# Altium schematic symbol library Hydra_Ref_sch.SCHLIB: 791 symbols (part 5 of 5)
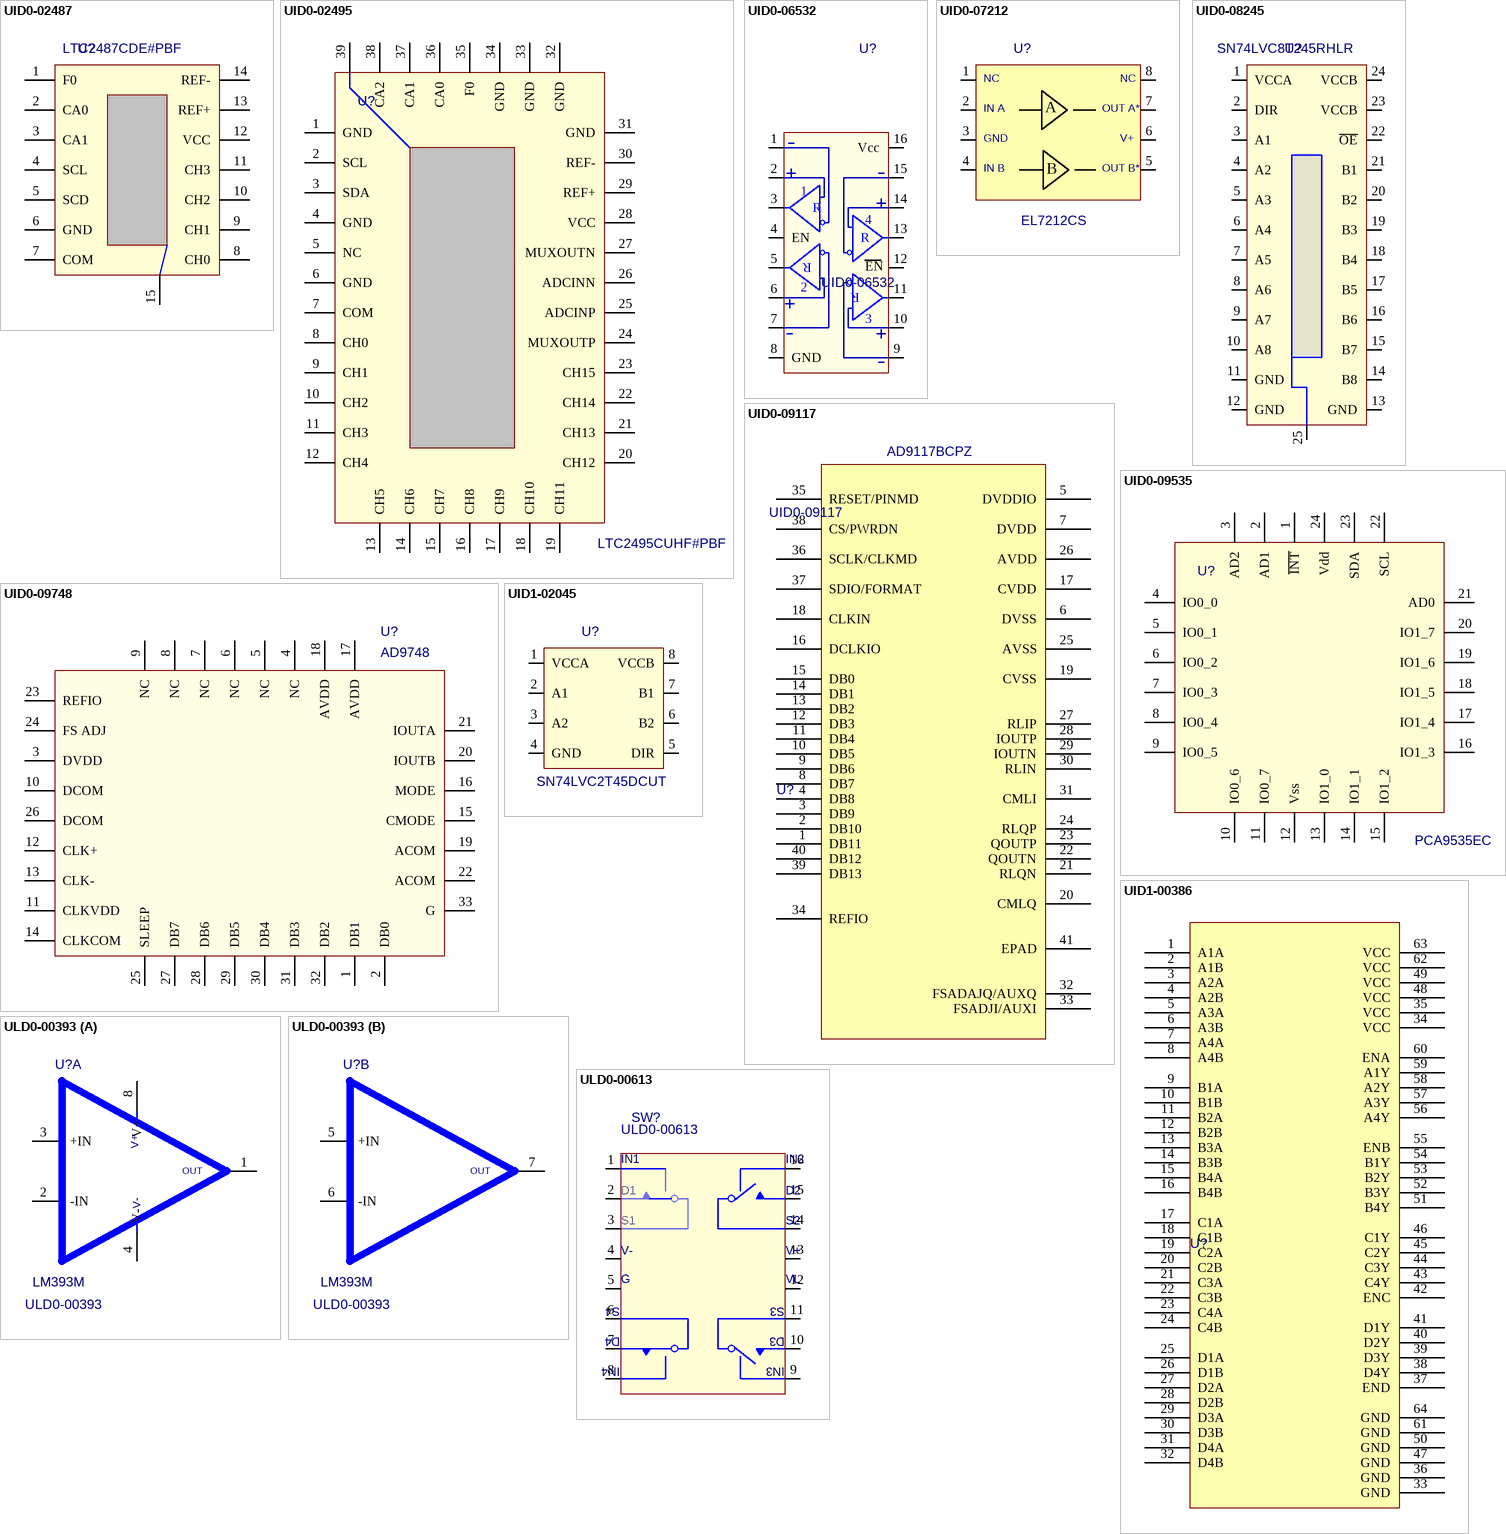
[diagram p26: symbols UID0-02487 to ULD0-00613]

## UID0-09117
designator U?  M_PN: AD9117BCPZ
DAC_14B_QUAD;PIO-IN;20MA-OUT;1.8V,3.3V;40-LEAD;LFCSP_VQ; MFGR: ANALOG DEVICES; level: 1; G_PN: UID0-09117; item_number: UID0-09117
footprint QFN50P600X600X100-40N (QFN, 40-Leads, Body 6.0x6.0mm (max), Pitch 0.50mm, IPC Medium Density)
pins: 1 DB11, 2 DB10, 3 DB9, 4 DB8, 5 DVDDIO, 6 DVSS, 7 DVDD, 8 DB7, 9 DB6, 10 DB5, 11 DB4, 12 DB3, 13 DB2, 14 DB1, 15 DB0, 16 DCLKIO, 17 CVDD, 18 CLKIN, 19 CVSS, 20 CMLQ, 21 RLQN, 22 QOUTN, 23 QOUTP, 24 RLQP, 25 AVSS, 26 AVDD, 27 RLIP, 28 IOUTP, 29 IOUTN, 30 RLIN, 31 CMLI, 32 FSADAJQ/AUXQ, 33 FSADJI/AUXI, 34 REFIO, 35 RESET/PINMD, 36 SCLK/CLKMD, 37 SDIO/FORMAT, 38 CS/PWRDN, 39 DB13, 40 DB12, 41 EPAD

## UID0-09535
designator U?, comment M_PN: PCA9535EC  (hidden comment: 16-bit I2C-bus GPIO;3.3V SUPPLY;OPEN DRAIN OUTPUTS;QFN24)
Value: PCA9535EC; NoLoad: .; Approved: CL; MFGR: ON SEMI; G_PN: UID0-09535; level: 1; ModifyDate: 5/10/12; item_number: UID0-09535
footprint SOIC127P1539X265-24N (SOP, 16-Leads, Body 10.1x5.3mm, Pitch 1.27mm, IPC Medium Density    SOP, 24-Leads, Body 15.39x7.5x2.65mm, Pitch 1.27mm, IPC Medium Density)
pins: 1 ~{INT}, 2 AD1, 3 AD2, 4 IO0_0, 5 IO0_1, 6 IO0_2, 7 IO0_3, 8 IO0_4, 9 IO0_5, 10 IO0_6, 11 IO0_7, 12 Vss, 13 IO1_0, 14 IO1_1, 15 IO1_2, 16 IO1_3, 17 IO1_4, 18 IO1_5, 19 IO1_6, 20 IO1_7, 21 AD0, 22 SCL, 23 SDA, 24 Vdd

## UID0-09748
designator U?, comment M_PN: AD9748  (hidden comment: AD9748 8-Bit, 210 MSPS, DIFF OUTPUT CURRENT, Tx DAC, 3.3V, SMT 32 pin LFCSP PKG)
MFGR: ANALOG DEVICES; Approved: NM; NoLoad: .; G_PN: UID0-09748; level: 1; ModifyDate: 12/05/12; item_number: UID0-09748
footprint QFN50P500X500X100-33V2N (Jedec-MO-220-VHHD-2; QFN, 33-Leads, Body 5x5x1mm, Pitch 0.50mm, IPC Medium Density)
pins: 1 DB1, 2 DB0, 3 DVDD, 4 NC, 5 NC, 6 NC, 7 NC, 8 NC, 9 NC, 10 DCOM, 11 CLKVDD, 12 CLK+, 13 CLK-, 14 CLKCOM, 15 CMODE, 16 MODE, 17 AVDD, 18 AVDD, 19 ACOM, 20 IOUTB, 21 IOUTA, 22 ACOM, 23 REFIO, 24 FS ADJ, 25 SLEEP, 26 DCOM, 27 DB7, 28 DB6, 29 DB5, 30 DB4, 31 DB3, 32 DB2, 33 G

## UID1-00386
designator U?
16 LINE RECEIVERS;LVDS;3.3V SUPPLY;INT TERMINATIONS;TSSOP-64; NoLoad: .; Approved: CL; Value: SN65LVDT386DGGR; MFGR: TEXAS INSTRUMENT; level: 1; ModifyDate: 3/20/13; M_PN: SN65LVDT386DGGR; item_number: UID1-00386; G_PN: UID1-00386
footprint SOP50P810X120-64M (SOP, 64-Leads, Body 17.1x6.2mm (max), Pitch 0.50mm)
pins: 1 A1A, 2 A1B, 3 A2A, 4 A2B, 5 A3A, 6 A3B, 7 A4A, 8 A4B, 9 B1A, 10 B1B, 11 B2A, 12 B2B, 13 B3A, 14 B3B, 15 B4A, 16 B4B, 17 C1A, 18 C1B, 19 C2A, 20 C2B, 21 C3A, 22 C3B, 23 C4A, 24 C4B, 25 D1A, 26 D1B, 27 D2A, 28 D2B, 29 D3A, 30 D3B, 31 D4A, 32 D4B, 33 GND, 34 VCC, 35 VCC, 36 GND, 37 END, 38 D4Y, 39 D3Y, 40 D2Y, 41 D1Y, 42 ENC, 43 C4Y, 44 C3Y, 45 C2Y, 46 C1Y, 47 GND, 48 VCC, 49 VCC, 50 GND, 51 B4Y, 52 B3Y, 53 B2Y, 54 B1Y, 55 ENB, 56 A4Y, 57 A3Y, 58 A2Y, 59 A1Y, 60 ENA, 61 GND, 62 VCC, 63 VCC, 64 GND

## UID1-02045
designator U?, comment M_PN: SN74LVC2T45DCUT  (hidden comment: SSN74LVC2T45YZPR;1.6V/5.5V;2-bit;dual supply non-inverting level traslator;DCU package)
Value: SN74LVC2T45DCUT; NoLoad: .; Approved: CL; MFGR: TEXAS INSTRUMENTS; G_PN: UID1-02045; level: 1; ModifyDate: 6/12/14; item_number: UID1-02045
footprint DCU-TI (old part)
pins: 1 VCCA, 2 A1, 3 A2, 4 GND, 5 DIR, 6 B2, 7 B1, 8 VCCB

## ULD0-00393
designator U?, comment M_PN: LM393M  G_PN: ULD0-00393  (hidden comment: COMPARATOR;DUAL;3MV.VOS;5NA IOS; SOIC-8)
Value: LM393M; NoLoad: .; Approved: CL; MFGR: ON SEMI; level: 1; ModifyDate: 02/22/12; item_number: ULD0-00393
footprint SO8_MS-012 (JEDEC M-012)
part A pins: 1 OUT, 2 -IN, 3 +IN, 4 V-, 8 V+
part B pins: 5 +IN, 6 -IN, 7 OUT

## ULD0-00613
designator SW?, comment G_PN: ULD0-00613  (hidden comment: QUAD SPST ANALOG SW;200NS;45 OHM;SO-16)
Value: DG613DY; MFGR: VISHAY; NoLoad: .; Approved: NM; level: 1; ModifyDate: 2/20/13; M_PN: DG613DY; item_number: ULD0-00613
footprint SOIC-16_Vishay (Footprint not found)
pins: 1 IN1, 2 D1, 3 S1, 4 V-, 5 G, 6 S4, 7 D4, 8 IN4, 9 IN3, 10 D3, 11 S3, 12 VL, 13 V+, 14 S2, 15 D2, 16 IN2

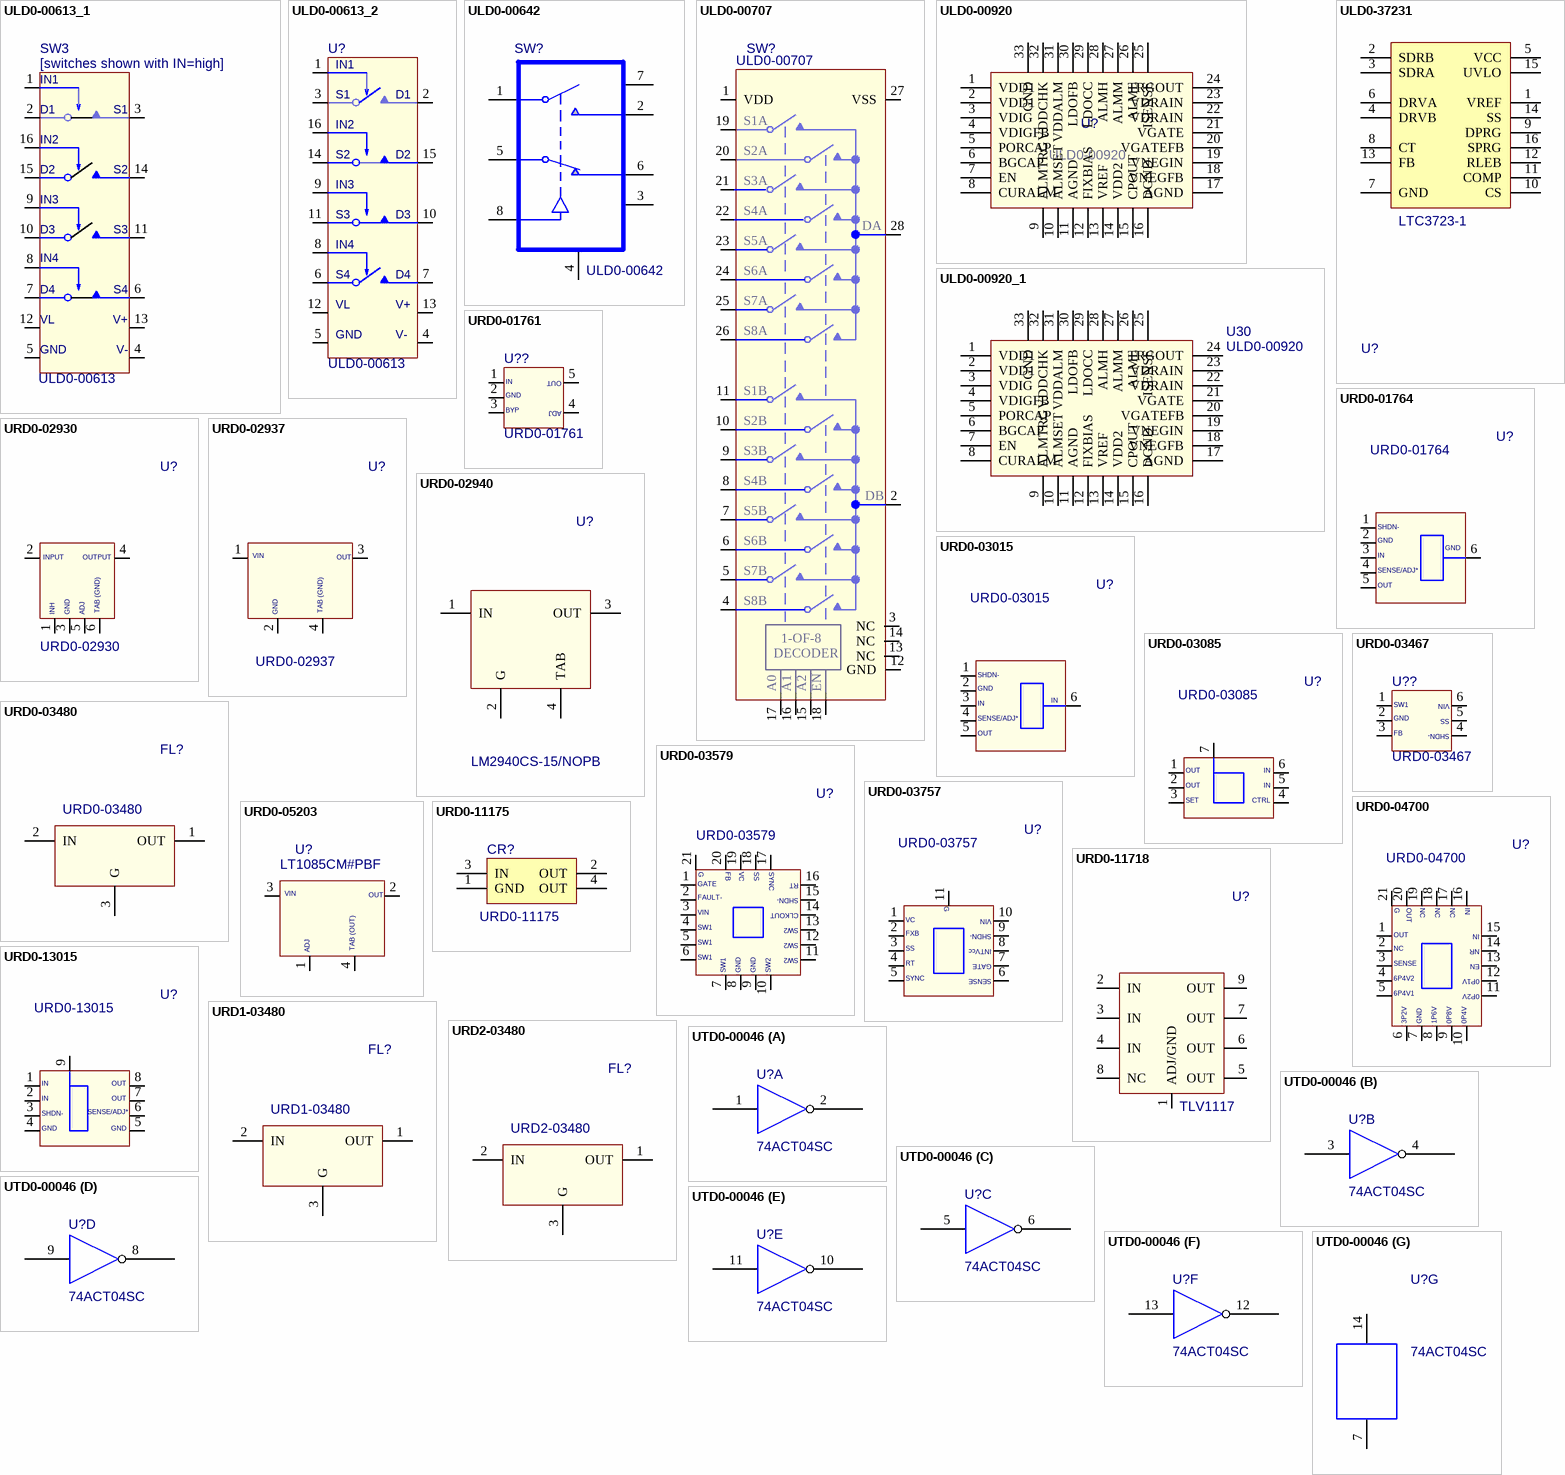
[diagram p20: symbols ULD0-00613_1 to UTD0-00046]

## ULD0-00613_1
designator SW3, comment [switches shown with IN=high]  G_PN: ULD0-00613
QUAD SPST ANALOG SW;200NS;45 OHM;SO-16; Value: DG613DY; MFGR: VISHAY; NoLoad: .; Approved: NM; level: 1; line_number: 1060; ModifyDate: 2/20/13; M_PN: DG613DY; item_number: ULD0-00613
footprint SOIC-16_Vishay (Footprint not found)
pins: 1 IN1, 2 D1, 3 S1, 4 VL, 5 IN2, 6 S4, 7 D4, 8 IN4, 9 IN3, 10 D3, 11 S3, 12 VL, 13 V+, 14 S2, 15 D2, 16 S1
text: GND; V-

## ULD0-00613_2
designator U?  G_PN: ULD0-00613
QUAD SPST ANALOG SW;12NS;500MHZ;18OHM; Value: {Value}; NoLoad: .; Approved: CL/MH; MFGR: Vishay Siliconix; M_PN: DG613DY; level: 1; ModifyDate: 2015-11-30; item_number: ULD0-00613
footprint SOIC127P600X175-16N (SOIC, 16-Leads, Body 9.90x3.90mm, Pitch 1.27mm, IPC Medium Density)
pins: 1 IN1, 2 D1, 3 S1, 4 VL, 5 IN2, 6 S4, 7 D4, 8 IN4, 9 IN3, 10 D3, 11 S3, 12 VL, 13 V+, 14 S2, 15 D2, 16 S1
text: GND; V-

## ULD0-00642
designator SW?, comment G_PN: ULD0-00642  (hidden comment: SPST ANALOG SWITCH:50NS;500MHz;50HM;SMT PACKAGE SOIC-8)
Value: DG642DY; MFGR: TEMIC; NoLoad: .; Approved: CL; level: 1; M_PN: DG642DY; ModifyDate: 4/12/12; item_number: ULD0-00642
footprint SO8_MS-012 (JEDEC M-012)
pins: 1 S1, 2 D1, 3 V-, 4 GND, 5 S2, 6 D2, 7 V+, 8 IN

## ULD0-00707
designator SW?, comment G_PN: ULD0-00707  (hidden comment: MULTIPLEXER;DIFFERENTIAL 8 TO 1;1.8-5.5V SUP;2.5 OHM ON;TSSOP-28)
MFGR: ANALOG DEVICES; NoLoad: .; Approved: NM; M_PN: ADG707; level: 1; ModifyDate: 10/24/12; item_number: ULD0-00707
footprint TSSOP65P640X110-28N (TSOP, 28-Leads, Body 9.8x4.5mm (max), Pitch 0.65mm, IPC Medium Density)
pins: 1 VDD, 2 DB, 3 NC, 4 S8B, 5 S7B, 6 S6B, 7 S5B, 8 S4B, 9 S3B, 10 S2B, 11 S1B, 12 GND, 13 NC, 14 NC, 15 A2, 16 A1, 17 A0, 18 EN, 19 S1A, 20 S2A, 21 S3A, 22 S4A, 23 S5A, 24 S2, 25 S7A, 26 S8A, 27 VSS, 28 DA
text: S6A; 1-OF-8; DECODER

## ULD0-00920
designator U?  G_PN: ULD0-00920
HMC920LP5E ACTIVE BIAS CONTROLLER;1 OUT;16.5V MAX IN;QFN-32; Approved: CL; MFGR: Hittite; NoLoad: .; level: 1; ModifyDate: 2/26/2013; M_PN: HMC920LP5E; Value: HMC920LP5E; item_number: ULD0-00920
footprint LP5(E)_HITTITE (LP5E 5X5MM QUAD FLATPACK NO-LEAD(QFN) PLASTIC PACKAGE)
footprint LP5E_HITTITE
pins: 1 VDD1, 2 VDD1, 3 VDIG, 4 VDIGFB, 5 PORCAP, 6 BGCAP, 7 EN, 8 CURALM, 9 ALMTRG, 10 ALMSET, 11 AGND, 12 FIXBIAS, 13 VREF, 14 VDD2, 15 CPOUT, 16 DGND, 17 AGND, 18 VNEGFB, 19 VNEGIN, 20 VGATEFB, 21 VGATE, 22 VDRAIN, 23 VDRAIN, 24 TRGOUT, 25 ISENSE, 26 ALML, 27 ALMM, 28 ALMH, 29 LDOCC, 30 LDOFB, 31 VDDALM, 32 VDDCHK, 33 GND

## ULD0-00920_1
designator U30  G_PN: ULD0-00920  (hidden comment: ULD0-00920_1)
HMC920LP5E ACTIVE BIAS CONTROLLER;1 OUT;16.5V MAX IN;QFN-32; Approved: CL; MFGR: Hittite; NoLoad: .; level: 1; line_number: 1205; ModifyDate: 2/26/2013; M_PN: HMC920LP5E; Value: HMC920LP5E; item_number: ULD0-00920
footprint LP5(E)_HITTITE_NO_VIAS (LP5E 5X5MM QUAD FLATPACK NO-LEAD(QFN) PLASTIC PACKAGE)
footprint LP5E_HITTITE_NO_VIAS
pins: 1 VDD1, 2 VDD1, 3 VDIG, 4 VDIGFB, 5 PORCAP, 6 BGCAP, 7 EN, 8 CURALM, 9 ALMTRG, 10 ALMSET, 11 AGND, 12 FIXBIAS, 13 VREF, 14 VDD2, 15 CPOUT, 16 DGND, 17 AGND, 18 VNEGFB, 19 VNEGIN, 20 VGATEFB, 21 VGATE, 22 VDRAIN, 23 VDRAIN, 24 TRGOUT, 25 ISENSE, 26 ALML, 27 ALMM, 28 ALMH, 29 LDOCC, 30 LDOFB, 31 VDDALM, 32 VDDCHK, 33 GND

## ULD0-37231
designator U?  M_PN: LTC3723-1
PWM CONTROLLER;SYNC PUSH-PULL;1.5A;SSOP-16; NoLoad: .; Approved: NM; MFGR: LINEAR; G_PN: ULD0-37231; level: 1; ModifyDate: 10/27/12; item_number: ULD0-37231
footprint SOP63P600X175-16N (16-Pin Plastic SSOP 0.635mm Pitch, IPC Nom. Density)
pins: 1 VREF, 2 SDRB, 3 SDRA, 4 DRVB, 5 VCC, 6 DRVA, 7 GND, 8 CT, 9 DPRG, 10 CS, 11 COMP, 12 RLEB, 13 FB, 14 SS, 15 UVLO, 16 SPRG

## URD0-01761
designator U??, comment G_PN: URD0-01761  (hidden comment: LT1761ES5-BYP;1.8V-20V IN;100mA;LOW NOISE;SOT-23-5)
MFGR: LINEAR TECH; Approved: CL; NoLoad: .; Value: LT1761ES5-BYP#TRMPBF; level: 1; ModifyDate: 6/6/13; M_PN: LT1761ES5-BYP#TRMPBF; item_number: URD0-01761
footprint SOT23-5_LINEAR
pins: 1 IN, 2 GND, 3 BYP, 4 ADJ, 5 OUT

## URD0-01764
designator U?, comment G_PN: URD0-01764  (hidden comment: 20V MAX;3A;.34V DROPOUT;LOW NOISE;D2PAK;RoHS)
MFGR: LINEAR; Approved: CL; NoLoad: .; Value: LT1764EQ#PBF; level: 1; ModifyDate: 5/10/13; M_PN: LT1764EQ#PBF; item_number: URD0-01764
footprint D2PAK-5_LINEAR (Footprint not found)
pins: 1 ~{SHDN}, 2 GND, 3 IN, 4 SENSE/ADJ*, 5 OUT, 6 GND
text: SHDN-

## URD0-02930
designator U?, comment G_PN: URD0-02930  (hidden comment: 30V MAX;3A;.4V DROPOUT;P2PAK;RoHS)
MFGR: ST MICROELECTRONICS; Approved: CL; NoLoad: .; Value: LD29300P2MTR; level: 1; ModifyDate: 5/8/13; M_PN: LD29300P2MTR; item_number: URD0-02930
footprint P2PAK_ST (Footprint not found)
pins: 1 INH, 2 INPUT, 3 ADJ, 4 OUTPUT, 5 ADJ, 6 TAB (GND)
text: GND

## URD0-02937
designator U?, comment G_PN: URD0-02937  (hidden comment: 26V MAX;.5A;.5V DROPOUT;D2PAK;RoHS)
MFGR: TEXAS INSTRUMENTS; Approved: CL; NoLoad: .; Value: LM2937ESX-8.0/NOPB; level: 1; ModifyDate: 5/8/13; M_PN: LM2937ESX-8.0/NOPB; item_number: URD0-02937
footprint D2PAK_TI (Footprint not found)
pins: 1 VIN, 2 GND, 3 OUT, 4 TAB (GND)

## URD0-02940
designator U?, comment M_PN: LM2940CS-15/NOPB  (hidden comment: LM2940CS-15;1A;60V MAX IN;15V OUT;TO-263;RoHS)
MFGR: ON SEMI; Approved: CL; NoLoad: .; Value: LM2940CS-15/NOPB; G_PN: URD0-02940; level: 1; ModifyDate: 6/5/12; item_number: URD0-02940
footprint TO-263-4N-TS3B (3-lead TO-263, NS Package TS3B)
pins: 1 IN, 2 G, 3 OUT, 4 TAB

## URD0-03015
designator U?, comment G_PN: URD0-03015  (hidden comment: 1.8-30V;1.5A;0.4V DROPOUT;LOW NOISE;NEGATIVE;D2PAK)
MFGR: LINEAR; Approved: CL; NoLoad: .; Value: LT3015EQ#PBF; level: 1; ModifyDate: 5/10/13; M_PN: LT3015EQ#PBF; item_number: URD0-03015
footprint D2PAK-5_LINEAR (Footprint not found)
pins: 1 ~{SHDN}, 2 GND, 3 IN, 4 SENSE/ADJ*, 5 OUT, 6 GND
text: SHDN-

## URD0-03085
designator U?, comment G_PN: URD0-03085  (hidden comment: LT3085EDCB#TRMPBF;Adjustable;.5A;Single Resistor;Low Dropout Regulator)
MFGR: LINEAR; Approved: CL; NoLoad: .; level: 1; ModifyDate: 5/13/13; Value: LT3085EDCB#TRMPBF; M_PN: LT3085EDCB#TRMPBF; item_number: URD0-03085
footprint DCB_LINEAR (SON, 6-Leads, Body 2x3mm, Pitch 0.5mm, Thermal Pad 1.35x1.65mm)
pins: 1 OUT, 2 OUT, 3 SET, 4 CTRL, 5 IN, 6 IN, 7 PADDLE

## URD0-03467
designator U??, comment G_PN: URD0-03467  (hidden comment: 42V MAX IN;.54A MAX OUTPUT;1.3MHZ;SOT-23-6)
MFGR: LINEAR TECH; Approved: CL; NoLoad: .; Value: LT3467ES6#TRMPBF; level: 1; ModifyDate: 4/30/13; M_PN: LT3467ES6#TRMPBF; item_number: URD0-03467
footprint SOT-23-6_LINEAR (Footprint not found)
pins: 1 SW1, 2 GND, 3 FB, 4 ~{SHDN}, 5 SS, 6 VIN
text: SHDN-

## URD0-03480
designator FL?, comment G_PN: URD0-03480  (hidden comment: 12V;5%;.1A;13.5V IN MIN;30V IN MAX;SOT-23)
MFGR: TI; Approved: CL; NoLoad: .; Value: LM3480IM3X-12/NOPB; level: 1; ModifyDate: 5/8/12; M_PN: LM3480IM3X-12/NOPB; item_number: URD0-03480
footprint SOT23-N (.95mm PITCH 1.3mmW 2.9mmL 1.1mmH)
pins: 1 OUT, 2 IN, 3 G

## URD0-03579
designator U?, comment G_PN: URD0-03579  (hidden comment: 40V MAX IN;6A MAX OUTPUT;2.5MHZ MAX;QFN-20)
MFGR: LINEAR TECH; Approved: CL; NoLoad: .; Value: LT3579EUFD#PBF; level: 1; ModifyDate: 5/1/13; M_PN: LT3579EUFD#PBF; item_number: URD0-03579
footprint QFN-20_LINEAR (Footprint not found)
pins: 1 GATE, 2 ~{FAULT}, 3 VIN, 4 SW1, 5 SW1, 6 SW1, 7 SW1, 8 GND, 9 GND, 10 SW2, 11 SW2, 12 SW2, 13 SW2, 14 CLKOUT, 15 ~{SHDN}, 16 RT, 17 SYNC, 18 SS, 19 VC, 20 FB, 21 PADDLE
text: G; SHDN-; FAULT-

## URD0-03757
designator U?, comment G_PN: URD0-03757  (hidden comment: BOOST/SEPIC/INVERTING REGULATOR;40V MAX  IN;1MHZ MAX;DFN-10)
MFGR: LINEAR TECHNOLOGY; Approved: CL; NoLoad: .; Value: LT3757EDD#PBF; level: 1; ModifyDate: 5/6/13; M_PN: LT3757EDD#PBF; item_number: URD0-03757
footprint DFN-10_LINEAR (Footprint not found)
pins: 1 VC, 2 FXB, 3 SS, 4 RT, 5 SYNC, 6 SENSE, 7 GATE, 8 INTVcc, 9 ~{SHDN}, 10 VIN, 11 PADDLE
text: G; SHDN-

## URD0-04700
designator U?, comment G_PN: URD0-04700  (hidden comment: TPS7A4700;1.4V-20.5V;1A;36V IN MAX;QFN-20)
MFGR: TI; Approved: CL; NoLoad: .; Value: TPS7A4700RGWT; level: 1; ModifyDate: 5/1/13; M_PN: TPS7A4700RGWT; item_number: URD0-04700
footprint QFN-20_TI (Footprint not found)
pins: 1 OUT, 2 NC, 3 SENSE, 4 6P4V2, 5 6P4V1, 6 3P2V, 7 GND, 8 1P6V, 9 0P8V, 10 0P4V, 11 0P2V, 12 0P1V, 13 EN, 14 NR, 15 IN, 16 IN, 17 NC, 18 NC, 19 NC, 20 OUT, 21 PADDLE
text: G

## URD0-05203
designator U?, comment M_PN: LT1085CM#PBF  (hidden comment: 1.25-13V;3A;1.15V DROPOUT;D2PAK)
MFGR: LINEAR TECHNOLOGY; Approved: CL; NoLoad: .; Value: LT1085CM#PBF; G_PN: URD0-05203; level: 1; ModifyDate: 5/7/13; item_number: URD0-05203
footprint D2PAK-3_LINEAR (Footprint not found)
pins: 1 ADJ, 2 OUT, 3 VIN, 4 TAB (OUT)

## URD0-11175
designator CR?, comment G_PN: URD0-11175  (hidden comment: 5V;.8A;6/15V IN MIN/MAX;TO-223)
NoLoad: .; Approved: NM; MFGR: Texas Instruments; M_PN: REG1117-5; level: 1; Value: *; ModifyDate: 11/14/12; item_number: URD0-11175
footprint SOT143
pins: 1 GND (power), 2 OUT (power), 3 IN (power), 4 OUT (power)

## URD0-11718
designator U?, comment M_PN: TLV1117  (hidden comment: 1.8V;.8A;3.2 TO 15V IN;QFN/SON-8)
MFGR: TI; Approved: NM; NoLoad: .; G_PN: URD0-11718; level: 1; ModifyDate: 10/27/12; item_number: URD0-11718
footprint SON80P400X400-X80-9N (SOP no Lead 8+1 Leads, Body 4x4mm (nominal), Pitch .80mm, IPC Medium Density)
pins: 1 ADJ/GND, 2 IN, 3 IN, 4 IN, 5 OUT, 6 OUT, 7 OUT, 8 NC, 9 OUT

## URD0-13015
designator U?, comment G_PN: URD0-13015  (hidden comment: 1.8-30V;1.5A;0.4V DROPOUT;LOW NOISE;NEGATIVE;8DFN)
MFGR: LINEAR; Approved: CL; NoLoad: .; Value: LT3015EDD#PBF; level: 1; ModifyDate: 5/14/13; M_PN: LT3015EDD#PBF; item_number: URD0-13015
footprint DFN-8_LINEAR
pins: 1 IN, 2 IN, 3 ~{SHDN}, 4 GND, 5 GND, 6 SENSE/ADJ*, 7 OUT, 8 OUT, 9 GND
text: SHDN-

## URD1-03480
designator FL?, comment G_PN: URD1-03480  (hidden comment: 5V;5%;.1A;6.2V IN MIN;30V IN MAX;SOT-23)
MFGR: TI; Approved: CL; NoLoad: .; Value: LM3480IM3X-5.0/NOPB; level: 1; ModifyDate: 5/8/12; M_PN: LM3480IM3X-5.0/NOPB; item_number: URD1-03480
footprint SOT23-N (.95mm PITCH 1.3mmW 2.9mmL 1.1mmH)
pins: 1 OUT, 2 IN, 3 G

## URD2-03480
designator FL?, comment G_PN: URD2-03480  (hidden comment: 3.3V;5%;.1A;4.5V IN MIN;30V IN MAX;SOT-23)
MFGR: TI; Approved: CL; NoLoad: .; Value: LM3480IM3X-3.3/NOPB; level: 1; ModifyDate: 5/8/12; M_PN: LM3480IM3X-3.3/NOPB; item_number: URD2-03480
footprint SOT23-N (.95mm PITCH 1.3mmW 2.9mmL 1.1mmH)
pins: 1 OUT, 2 IN, 3 G

## UTD0-00046
designator U?, comment M_PN: 74ACT04SC  (hidden comment: HEX INVERTER;SOIC-14)
Value: 74ACT04D; G_PN: UTD0-00046; Approved: CL; NoLoad: .; MFGR: NATIONAL; level: 1; ModifyDate: 4/11/12; item_number: UTD0-00046
footprint SOIC14_MS-012 (SOP, 16-Leads, Body 10.1x5.3mm, Pitch 1.27mm, IPC Medium Density    SOP, 14-Leads, Body 8.7x6mm, Pitch 1.27mm, IPC Medium Density)
part A pins: 1 A, 2 Y
part B pins: 3 A, 4 Y
part C pins: 5 A, 6 Y
part D pins: 8 Y, 9 A
part E pins: 10 Y, 11 A
part F pins: 12 Y, 13 A
part G pins: 7 GND, 14 VCC

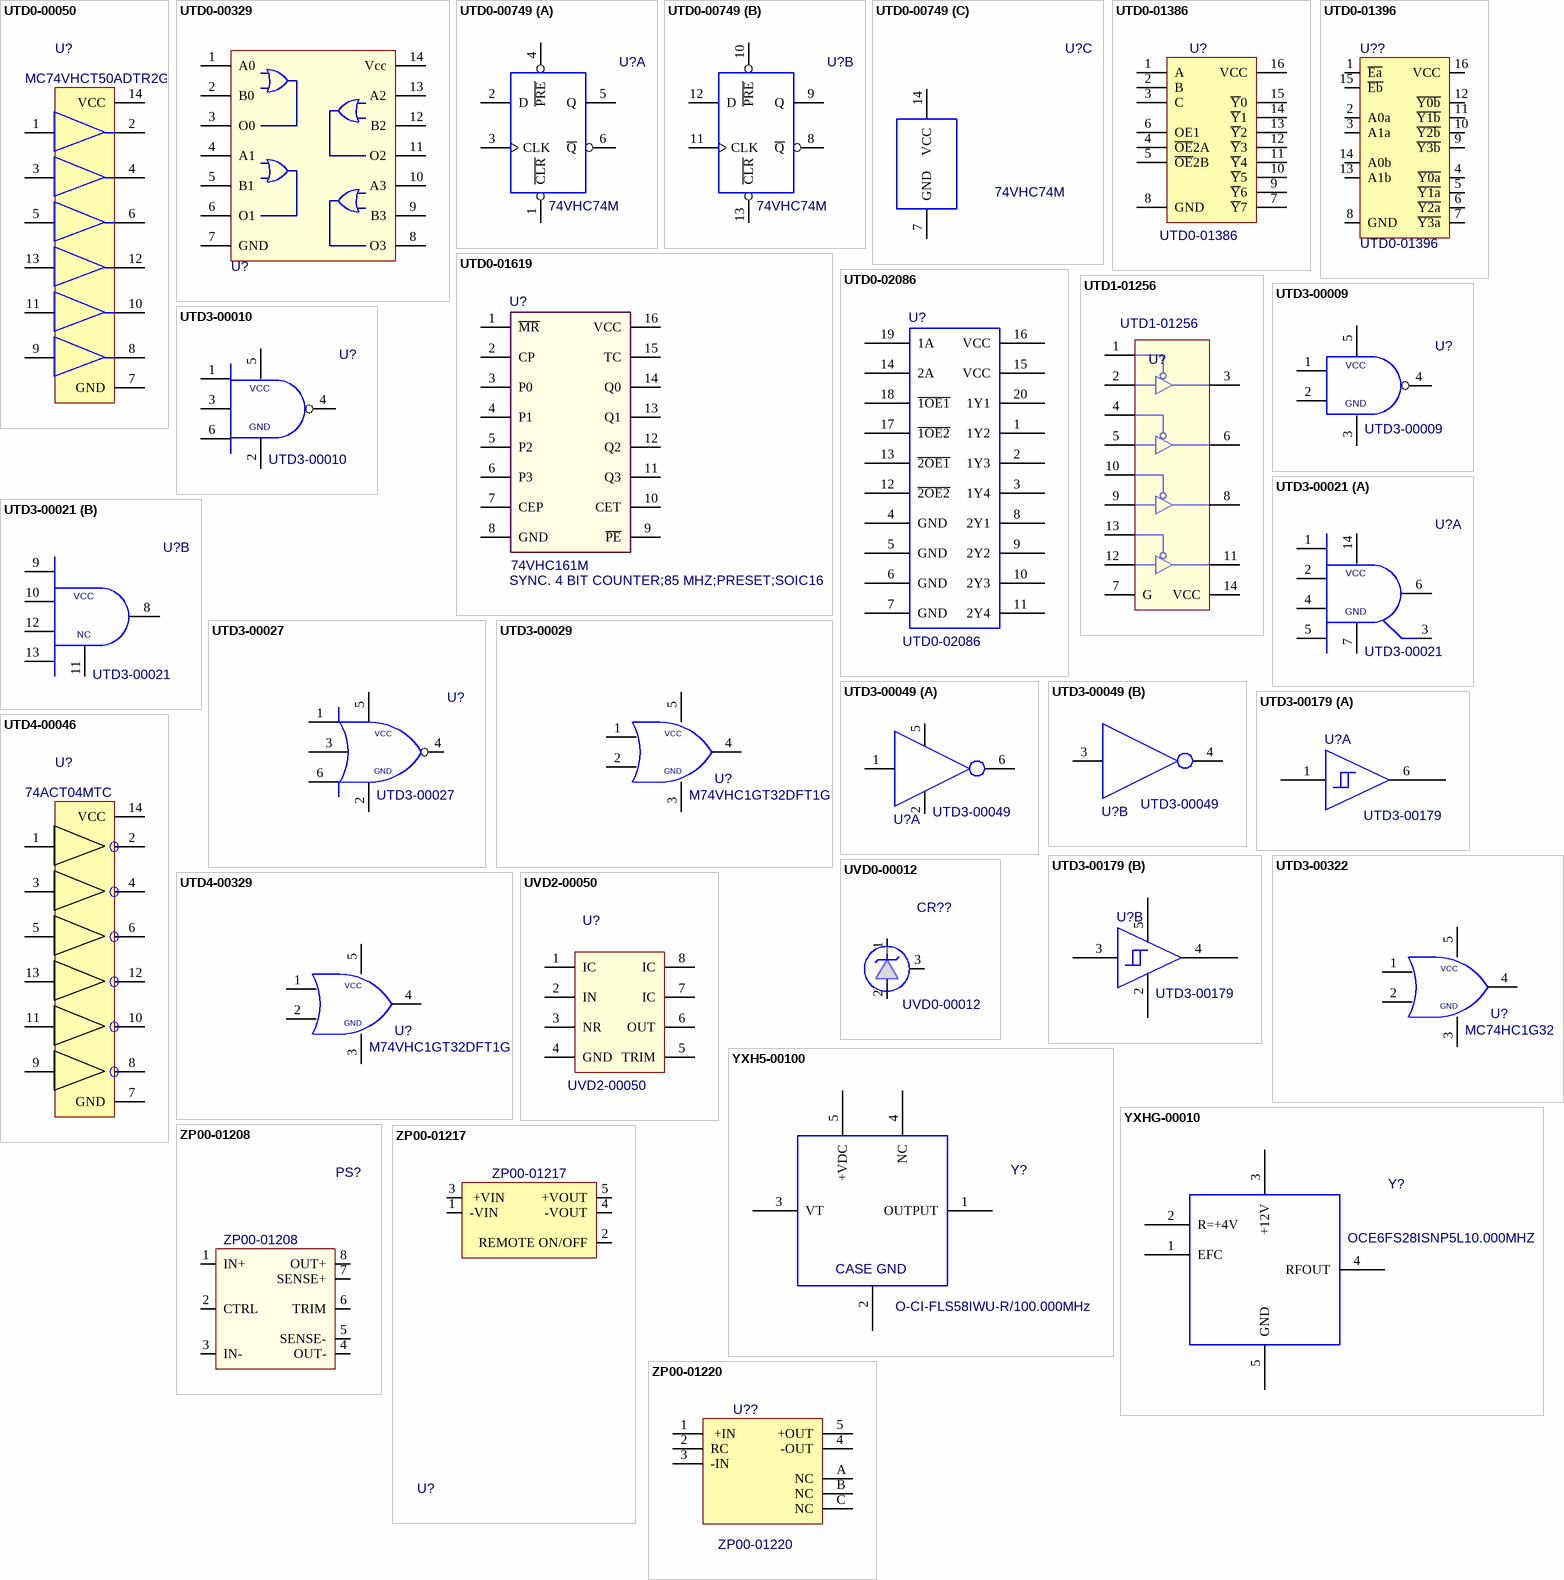
[diagram p21: symbols UTD0-00050 to ZP00-01220]

## UTD0-00050
designator U?, comment M_PN: MC74VHCT50ADTR2G  (hidden comment: MC74VHCT50A;HEX BUFFERS;3.5NS;TTL INPUTS;TSSOP-14)
Value: MC74VHCT50ADTR2G; MFGR: ON SEMI; NoLoad: .; Approved: CL; G_PN: UTD0-00050; level: 1; ModifyDate: 4/21/13; item_number: UTD0-00050
footprint TSOP65P640X120-14L (TSOP, 14-Leads, Body 5.00x4.40mm, Pitch 0.65mm, IPC High Density)
pins: 1, 2, 3, 4, 5, 6, 7 GND, 8, 9, 10, 11, 12, 13, 14 VCC

## UTD0-00329
designator U?, comment QUAD 2 IN OR GATES  (value not drawn)
Value: 74VHC32MTCX; NoLoad: .; Approved: CL; MFGR: FAIRCHILD; G_PN: UTD0-00329; level: 1; ModifyDate: 3/27/13; M_PN: 74VHC32MTCX; item_number: UTD0-00329
footprint TSSOP-14_ON_SEMI
pins: 1 A0, 2 B0, 3 O0, 4 A1, 5 B1, 6 O1, 7 GND, 8 O3, 9 B3, 10 A3, 11 O2, 12 B2, 13 A2, 14 Vcc

## UTD0-00749
designator U?, comment M_PN: 74VHC74M  (hidden comment: DUAL D FLIP-FLOP,EDGE TRIG,14 PIN SOIC)
Value: 74VHC74M; G_PN: UTD0-00749; NoLoad: .; Approved: CL; MFGR: FAIRCHILD; level: 1; ModifyDate: 4/11/12; item_number: UTD0-00749
footprint SOIC14_MS-012 (SOP, 16-Leads, Body 10.1x5.3mm, Pitch 1.27mm, IPC Medium Density    SOP, 14-Leads, Body 8.7x6mm, Pitch 1.27mm, IPC Medium Density)
part A pins: 1 ~{CLR}, 2 D, 3 CLK, 4 ~{PRE}, 5 Q, 6 ~{Q}
part B pins: 8 ~{Q}, 9 Q, 10 ~{PRE}, 11 CLK, 12 D, 13 ~{CLR}
part C pins: 7 GND, 14 VCC

## UTD0-01386
designator U?
3 TO 8 DECODER/DEMULTIPLEXER;74ACT138 LOGIC;SO-16; Approved: NM; MFGR: FAIRCHILD; M_PN: 74ACT138SC; NoLoad: .; level: 1; ModifyDate: 11/8/12; Value: *; G_PN: UTD0-01386; item_number: UTD0-01386
footprint SOIC16_MS-012 (SOP, 16-Leads, Body 10.1x5.3mm, Pitch 1.27mm, IPC Medium Density    SOP, 16-Leads, Body 10x6mm, Pitch 1.27mm, IPC Medium Density)
pins: 1 A, 2 B, 3 C, 4 ~{OE}2A, 5 ~{OE}2B, 6 OE1, 7 ~{Y}7, 8 GND, 9 ~{Y}6, 10 ~{Y}5, 11 ~{Y}4, 12 ~{Y}3, 13 ~{Y}2, 14 ~{Y}1, 15 ~{Y}0, 16 VCC

## UTD0-01396
designator U??  G_PN: UTD0-01396
2 TO 4 DECODER/DEMULTIPLEXER;74VHC139 LOGIC;SO-16; Approved: CL; MFGR: ON SEMI; M_PN: MC74VHC139DTR2G; NoLoad: .; Value: MC74VHC139DTR2G; level: 1; ModifyDate: 3/28/13; item_number: UTD0-01396
footprint TSSOP-16_ONSEMI (CASE 948F-01, ISSUE B)
pins: 1 ~{Ea}, 2 A0a, 3 A1a, 4 ~{Y0a}, 5 ~{Y1a}, 6 ~{Y2a}, 7 ~{Y3a}, 8 GND, 9 ~{Y3b}, 10 ~{Y2b}, 11 ~{Y1b}, 12 ~{Y0b}, 13 A1b, 14 A0b, 15 ~{Eb}, 16 VCC

## UTD0-01619
designator U?, comment SYNC. 4 BIT COUNTER;85 MHZ;PRESET;SOIC16  M_PN: 74VHC161M
Value: 74VHC161M; G_PN: UTD0-01619; NoLoad: .; Approved: CL; MFGR: FAIRCHILD; level: 1; ModifyDate: 4/11/12; item_number: UTD0-01619
footprint SOIC16_MS-012 (SOP, 16-Leads, Body 10.1x5.3mm, Pitch 1.27mm, IPC Medium Density    SOP, 16-Leads, Body 10x6mm, Pitch 1.27mm, IPC Medium Density)
pins: 1 ~{MR}, 2 CP, 3 P0, 4 P1, 5 P2, 6 P3, 7 CEP, 8 GND, 9 ~{PE}, 10 CET, 11 Q3, 12 Q2, 13 Q1, 14 Q0, 15 TC, 16 VCC

## UTD0-02086
designator U?, comment G_PN: UTD0-02086  (hidden comment: CLK DRV;DUAL 1:4;LOW SKEW;3-STATE;TTL IN)
Value: CDC208DW; NoLoad: .; Approved: CL; MFGR: TI; level: 1; M_PN: CDC208DW; ModifyDate: 4/20/12; item_number: UTD0-02086
footprint SO20WB-380-REV-A_UTD0-02086()
footprint SO20WB-380-REV-A
pins: 1 1Y2, 2 1Y3, 3 1Y4, 4 GND (power), 5 GND (power), 6 GND (power), 7 GND (power), 8 2Y1, 9 2Y2, 10 2Y3, 11 2Y4, 12 ~{2OE2}, 13 ~{2OE1}, 14 2A, 15 VCC (power), 16 VCC (power), 17 ~{1OE2}, 18 ~{1OE1}, 19 1A, 20 1Y1

## UTD1-01256
designator U?, comment G_PN: UTD1-01256  (hidden comment: QUAD;3 STATE NON-INV. BUFFER;TTL LEVELS;SO-14)
Value: MC74VHCT125ADTRG; NoLoad: .; Approved: CL; MFGR: ON SEMI; level: 1; M_PN: MC74VHCT125ADTRG; ModifyDate: 3/28/13; item_number: UTD1-01256
footprint SO20WB-380-REV-A_UTD0-02086()
footprint TSOP65P640X120-14L (TSOP, 14-Leads, Body 5.00x4.40mm, Pitch 0.65mm, IPC High Density)
pins: 1 ~{OE1}, 2 A1, 3 Y1 (power), 4 ~{OE2}, 5 A2, 6 Y2 (power), 7 G (power), 8 Y3 (power), 9 A3, 10 ~{OE3}, 11 Y4 (power), 12 A4, 13 ~{OE4}, 14 VCC (power)

## UTD3-00009
designator U?, comment G_PN: UTD3-00009  (hidden comment: SINGLE 2-IN NAND GATE;SOT-353)
M_PN: MC74VHC1GT00; Value: MC74VHC1GT00; NoLoad: .; Approved: CL; level: 1; ModifyDate: 3/19/12; item_number: UTD3-00009
footprint SOT-353 (JEDEC MO-203AA)
pins: 1 A, 2 B, 3 GND, 4 Y, 5 VCC

## UTD3-00010
designator U?, comment G_PN: UTD3-00010  (hidden comment: NAND;SINGLE;3-INPUT;SC-70)
M_PN: SN74LVC1G10DCKR; Value: SN74LVC1G10DCKR; NoLoad: .; Approved: CL; MFGR: TI; level: 1; ModifyDate: 5/14/12; item_number: UTD3-00010
footprint SC-70 (Footprint not found)
pins: 1 A, 2 GND, 3 B, 4 Y, 5 VCC, 6 C

## UTD3-00021
designator U?, comment G_PN: UTD3-00021  (hidden comment: SN74HC21PWR;DUAL;4-INPUT;NAND;TSSOP-14)
NoLoad: .; Approved: CL; level: 1; M_PN: SN74HC21PWR; Value: SN74HC21PWR; ModifyDate: 5/14/12; item_number: UTD3-00021
footprint UTD3-00009_UTD3-00009(UTD3-00009)
footprint TSOP65P640X120-14L (TSOP, 14-Leads, Body 5.00x4.40mm, Pitch 0.65mm, IPC High Density)
part A pins: 1 1A, 2 1B, 3 NC, 4 1C, 5 1D, 6 1Y, 7 GND, 14 VCC
part B pins: 8 2Y, 9 2A, 10 2B, 11 NC, 12 2C, 13 2D

## UTD3-00027
designator U?, comment G_PN: UTD3-00027  (hidden comment: NOR;SINGLE;3-INPUT;SC-70)
M_PN: SN74LVC1G27DCKR; Value: SN74LVC1G27DCKR; NoLoad: .; Approved: CL; MFGR: TI; level: 1; ModifyDate: 5/17/12; item_number: UTD3-00027
footprint SOT-SC-70 (SOT (SC-70) DCK)
pins: 1 A, 2 GND, 3 B, 4 Y, 5 VCC, 6 C

## UTD3-00029
designator U?  M_PN: M74VHC1GT32DFT1G
M74VHC1GT32DFT1G SGL OR SOT-353 RoHS; G_PN: UTD3-00029; NoLoad: .; Approved: CL; MFGR: ON SEMI; level: 1; Value: M74VHC1GT32DFT1G; ModifyDate: 1/6/14; item_number: UTD3-00029
footprint SOT-353_ONSEMI (CASE 419A-02, ISSUE J)
pins: 1 B, 2 A, 3 GND, 4 Y, 5 VCC

## UTD3-00049
designator U?, comment G_PN: UTD3-00049  (hidden comment: INVERTER;DUAL;1.65-5.5V SUP;2NS TPD;SC70-6)
Value: NL27WZ04DFT2G; NoLoad: .; Approved: CL; MFGR: ON SEMI; level: 1; ModifyDate: 02/22/12; M_PN: NL27WZ04DFT2G; item_number: UTD3-00049
footprint SOT-363_419B (SC-88/SC70-6/SOT-363, CASE 419B-02, 6-Leads, Body 2.00x2.10mm, Pitch 0.65mm)
part A pins: 1 IN, 2 V-, 5 V+, 6 OUT
part B pins: 3 IN, 4 OUT

## UTD3-00179
designator U?, comment G_PN: UTD3-00179  (hidden comment: BUFFER;DUAL;SCHMITT TRIG;1.65-5.5V;SOT363)
M_PN: SN74LVC2G17DCKT; Value: SN74LVC2G17DCKT; NoLoad: .; Approved: CL; MFGR: TI; level: 1; ModifyDate: 08/20/2008 08:47:56; item_number: UTD3-00179
footprint SO6-SC70 SC88 (6-Lead SC70, EIAJ SC88, 1.25mm wide)
part A pins: 1 1A, 6 1Y
part B pins: 2 GND, 3 2A, 4 Y2, 5 VCC

## UTD3-00322
designator U?, comment M_PN: MC74HC1G32  (hidden comment: SINGLE 2 IN OR GATE SC-70)
Value: MC74HC1G32; G_PN: UTD3-00322; NoLoad: .; Approved: CL; MFGR: ON SEMI; level: 1; ModifyDate: 4/11/12; item_number: UTD3-00322
footprint SC88 SC70-5 (5Lead SC70, EIAJ SC88, 1.25mm wide)
footprint SC88_SC70-5
pins: 1 B, 2 A, 3 GND, 4 Y, 5 VCC

## UTD4-00046
designator U?, comment M_PN: 74ACT04MTC  (hidden comment: 74ACT04MTC HEX INVERTER;SMT;TSSOP-14)
MFGR: Fairchild; NoLoad: .; Approved: NM; G_PN: UTD4-00046; level: 1; Value: *; ModifyDate: 10/27/12; item_number: UTD4-00046
footprint TSOP65P640X120-14L (TSOP, 14-Leads, Body 5.00x4.40mm, Pitch 0.65mm, IPC High Density)
pins: 1, 2, 3, 4, 5, 6, 7 GND, 8, 9, 10, 11, 12, 13, 14 VCC

## UTD4-00329
designator U?, comment M_PN: M74VHC1GT32DFT1G  (hidden comment: M74VHC1GT32DFT1G SGL OR SOT-353 RoHS)
G_PN: UTD4-00329; NoLoad: .; Approved: CL; MFGR: ON SEMI; level: 1; Value: M74VHC1GT32DFT1G; ModifyDate: 6/21/14; item_number: UTD4-00329
footprint SOT-353_ONSEMI (CASE 419A-02, ISSUE J)
pins: 1 B, 2 A, 3 GND, 4 Y, 5 VCC

## UVD0-00012
designator CR??, comment G_PN: UVD0-00012  (hidden comment: VREF;1.235V;+/-4MV;.2MV 0-70 DEG C;SOT-23)
M_PN: LM385M3-1.2; MFGR: TI; NoLoad: .; Approved: CL; Value: LM385M3-1.2; level: 1; ModifyDate: 3/25/13; item_number: UVD0-00012
footprint SOT23-N (.95mm PITCH 1.3mmW 2.9mmL 1.1mmH)
pins: 1 C, 2 hidden, 2 A, 3 case

## UVD2-00050
designator U?, comment G_PN: UVD2-00050  (hidden comment: VREF;5V;+/-1MV;2PPM/DEG;15MA IOUT;SO-8)
M_PN: MAX6250ACSA; MFGR: MAXIM; NoLoad: .; Approved: CL; level: 1; Value: *; ModifyDate: 02/22/12; item_number: UVD2-00050
footprint SO8_MS-012 (JEDEC M-012)
pins: 1 IC, 2 IN, 3 NR, 4 GND, 5 TRIM, 6 OUT, 7 IC, 8 IC

## YXH5-00100
designator Y?, comment value O-CI-FLS58IWU-R/100.000MHz  (hidden comment: OSC;XTAL;100MHZ;12V;OVEN;50PPB;5X10E-9/DAY;1INSQ PKG)
NoLoad: .; G_PN: YXH5-00100; Approved: CL; MFGR: NEL; level: 1; M_PN: O-CI-FLS58IWU-R/100.000MHz; ModifyDate: 4/11/12; item_number: YXH5-00100
footprint OCXO_NEL_1x1_IN
pins: 1 OUTPUT, 2  GND, 3 VT, 4 NC, 5 +VDC
text: CASE GND

## YXHG-00010
designator Y?  M_PN: OCE6FS28ISNP5L10.000MHZ  (hidden comment: YXHG-00010)
OSCILLATOR; XTAL; 10MHZ; 12V; OVEN; 5x10-10/DAY; Value: OCE6FS28ISNP5L10.000MHZ; NoLoad: .; MFGR: NEL; Approved: CL; level: 1; ModifyDate: 3/11/12; G_PN: YXHG-00010; item_number: YXHG-00010
footprint OCXO_NEL_36x27_mm (OCXO)
pins: 1 EFC, 2 R=+4V, 3 +12V, 4 RFOUT, 5 GND

## ZP00-01208
designator PS?, comment G_PN: ZP00-01208  (hidden comment: DC-DC CONV;12V;8.3A;48V IN;N POL ON/OFF;1/16 BRICK;DIP MODULE)
MFGR: Giga-tronics; Approved: CL; NoLoad: .; Value: ULS-12/8.3-D48N-C; level: 1; ModifyDate: 4/26/13; M_PN: ULS-12/8.3-D48N-C; item_number: ZP00-01208
footprint ZP00-01208 (Footprint not found)
pins: 1 IN+, 2 CTRL, 3 IN-, 4 OUT-, 5 SENSE-, 6 TRIM, 7 SENSE+, 8 OUT+

## ZP00-01217
designator U?
DC-DC CONV;12V;17A;48V IN;W/BASEPLATE;N POL ON/OFF;QTR BRICK-5        Owner    Tony Ferro; MFGR: ANALOG DEVICES; M_PN: RBC-12_17-D48NB-C; level: 1; ModifyDate: KS; G_PN: ZP00-01217; item_number: ZP00-01217
footprint RBC-12/17-D48NB-C_POWER_MODULE (RBC-12/17-D48NB-C)
footprint RBC-12_17-D48NB-C_POWER_MODULE
pins: 1 -VIN, 2 REMOTE ON/OFF, 3  +VIN, 4 -VOUT, 5 +VOUT

## ZP00-01220
designator U??, comment G_PN: ZP00-01220  (hidden comment: DC-DC CONV;12V;20A;48V IN;W/BASEPLATE;NEG RC;EIGHTH-BRICK-5)
Approved: Frank; MFGR: ERICSSON; M_PN: PKB4204PIHS 48V TO 12V 20A DC-DC CONVERTER 8TH-BRK-5; level: 1; NoLoad: *; ModifyDate: 12/10/12; item_number: ZP00-01220
footprint PKB4000C-DC-DC-8PIN
pins: 1  +IN, 2 RC, 3 -IN, 4 -OUT, 5 +OUT, A NC, B NC, C NC

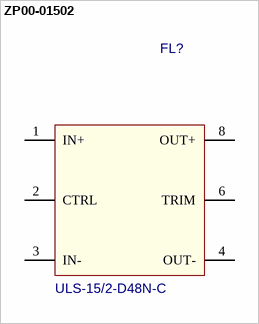
[diagram p22: symbol ZP00-01502]

## ZP00-01502
designator FL?, comment M_PN: ULS-15/2-D48N-C  (hidden comment: DC-DC CONV;15V;2A;48V IN;N POL ON/OFF;1/16 BRICK;DIP MODULE)
MFGR: MURATA; Approved: CL; NoLoad: .; Value: ULS-15/2-D48N-C; G_PN: ZP00-01502; level: 1; ModifyDate: 4/30/12; item_number: ZP00-01502
footprint CONV-ULS-15/2-D48N-C (1.3x0.9x.036" convetor -muRata)
footprint CONV-ULS-15_2-D48N-C
pins: 1 IN+, 2 CTRL, 3 IN-, 4 OUT-, 6 TRIM, 8 OUT+